# Altium footprint library BGA_Sq_127P.PcbLib: 89 footprints (part 15 of 20) (continued)
## BGA127P35X35-652 [mm] "BGA, 652-Leads, Body 45x45mm, Pitch 1.27mm" (continued)
Top Overlay:
  circle w0.25: c-23.15,21.59 r0.125
  region: -21.67,22.5 -22.5,21.67 -22.5,22.5
  lines w0.2: -22.5,21.67 -21.67,22.5 ; -22.5,-22.5 22.5,-22.5 22.5,22.5 -22.5,22.5 -22.5,-22.5
Mechanical 13:
  lines w0.1: -22.5,-22.5 22.5,-22.5 22.5,22.5 -22.5,22.5 -22.5,-22.5
Mechanical 15:
  lines w0.1: -0.5,0 0.5,0 ; 0,-0.5 0,0.5 ; -23.5,-23.5 23.5,-23.5 23.5,23.5 -23.5,23.5 -23.5,-23.5
3D body: height 3.5, standoff 0, extent -22.5,-22.5 22.5,22.5

## BGA127P35X35-1225 [mm] "BGA, 1225-Leads, Body 45x45mm, Pitch 1.27mm"
height 3.5
pads (1225):
  round 0.6 smd: A1(-21.59,21.59) A2(-20.32,21.59) A3(-19.05,21.59) A4(-17.78,21.59) A5(-16.51,21.59) A6(-15.24,21.59) A7(-13.97,21.59) A8(-12.7,21.59) A9(-11.43,21.59) A10(-10.16,21.59) A11(-8.89,21.59) A12(-7.62,21.59) A13(-6.35,21.59) A14(-5.08,21.59) A15(-3.81,21.59) A16(-2.54,21.59) A17(-1.27,21.59) A18(0,21.59) A19(1.27,21.59) A20(2.54,21.59) A21(3.81,21.59) A22(5.08,21.59) A23(6.35,21.59) A24(7.62,21.59) A25(8.89,21.59) A26(10.16,21.59) A27(11.43,21.59) A28(12.7,21.59) A29(13.97,21.59) A30(15.24,21.59) A31(16.51,21.59) A32(17.78,21.59) A33(19.05,21.59) A34(20.32,21.59) A35(21.59,21.59) AA1(-21.59,-3.81) AA2(-20.32,-3.81) AA3(-19.05,-3.81) AA4(-17.78,-3.81) AA5(-16.51,-3.81) AA6(-15.24,-3.81) AA7(-13.97,-3.81) AA8(-12.7,-3.81) AA9(-11.43,-3.81) AA10(-10.16,-3.81) AA11(-8.89,-3.81) AA12(-7.62,-3.81) AA13(-6.35,-3.81) AA14(-5.08,-3.81) AA15(-3.81,-3.81) AA16(-2.54,-3.81) AA17(-1.27,-3.81) AA18(0,-3.81) AA19(1.27,-3.81) AA20(2.54,-3.81) AA21(3.81,-3.81) AA22(5.08,-3.81) AA23(6.35,-3.81) AA24(7.62,-3.81) AA25(8.89,-3.81) AA26(10.16,-3.81) AA27(11.43,-3.81) AA28(12.7,-3.81) AA29(13.97,-3.81) AA30(15.24,-3.81) AA31(16.51,-3.81) AA32(17.78,-3.81) AA33(19.05,-3.81) AA34(20.32,-3.81) AA35(21.59,-3.81) AB1(-21.59,-5.08) AB2(-20.32,-5.08) AB3(-19.05,-5.08) AB4(-17.78,-5.08) AB5(-16.51,-5.08) AB6(-15.24,-5.08) AB7(-13.97,-5.08) AB8(-12.7,-5.08) AB9(-11.43,-5.08) AB10(-10.16,-5.08) AB11(-8.89,-5.08) AB12(-7.62,-5.08) AB13(-6.35,-5.08) AB14(-5.08,-5.08) AB15(-3.81,-5.08) AB16(-2.54,-5.08) AB17(-1.27,-5.08) AB18(0,-5.08) AB19(1.27,-5.08) AB20(2.54,-5.08) AB21(3.81,-5.08) AB22(5.08,-5.08) AB23(6.35,-5.08) AB24(7.62,-5.08) AB25(8.89,-5.08) AB26(10.16,-5.08) AB27(11.43,-5.08) AB28(12.7,-5.08) AB29(13.97,-5.08) AB30(15.24,-5.08) AB31(16.51,-5.08) AB32(17.78,-5.08) AB33(19.05,-5.08) AB34(20.32,-5.08) AB35(21.59,-5.08) AC1(-21.59,-6.35) AC2(-20.32,-6.35) AC3(-19.05,-6.35) AC4(-17.78,-6.35) AC5(-16.51,-6.35) AC6(-15.24,-6.35) AC7(-13.97,-6.35) AC8(-12.7,-6.35) AC9(-11.43,-6.35) AC10(-10.16,-6.35) AC11(-8.89,-6.35) AC12(-7.62,-6.35) AC13(-6.35,-6.35) AC14(-5.08,-6.35) AC15(-3.81,-6.35) AC16(-2.54,-6.35) AC17(-1.27,-6.35) AC18(0,-6.35) AC19(1.27,-6.35) AC20(2.54,-6.35) AC21(3.81,-6.35) AC22(5.08,-6.35) AC23(6.35,-6.35) AC24(7.62,-6.35) AC25(8.89,-6.35) AC26(10.16,-6.35) AC27(11.43,-6.35) AC28(12.7,-6.35) AC29(13.97,-6.35) AC30(15.24,-6.35) AC31(16.51,-6.35) AC32(17.78,-6.35) AC33(19.05,-6.35) AC34(20.32,-6.35) AC35(21.59,-6.35) AD1(-21.59,-7.62) AD2(-20.32,-7.62) AD3(-19.05,-7.62) AD4(-17.78,-7.62) AD5(-16.51,-7.62) AD6(-15.24,-7.62) AD7(-13.97,-7.62) AD8(-12.7,-7.62) AD9(-11.43,-7.62) AD10(-10.16,-7.62) AD11(-8.89,-7.62) AD12(-7.62,-7.62) AD13(-6.35,-7.62) AD14(-5.08,-7.62) AD15(-3.81,-7.62) AD16(-2.54,-7.62) AD17(-1.27,-7.62) AD18(0,-7.62) AD19(1.27,-7.62) AD20(2.54,-7.62) AD21(3.81,-7.62) AD22(5.08,-7.62) AD23(6.35,-7.62) AD24(7.62,-7.62) AD25(8.89,-7.62) AD26(10.16,-7.62) AD27(11.43,-7.62) AD28(12.7,-7.62) AD29(13.97,-7.62) AD30(15.24,-7.62) AD31(16.51,-7.62) AD32(17.78,-7.62) AD33(19.05,-7.62) AD34(20.32,-7.62) AD35(21.59,-7.62) AE1(-21.59,-8.89) AE2(-20.32,-8.89) AE3(-19.05,-8.89) AE4(-17.78,-8.89) AE5(-16.51,-8.89) AE6(-15.24,-8.89) AE7(-13.97,-8.89) AE8(-12.7,-8.89) AE9(-11.43,-8.89) AE10(-10.16,-8.89) AE11(-8.89,-8.89) AE12(-7.62,-8.89) AE13(-6.35,-8.89) AE14(-5.08,-8.89) AE15(-3.81,-8.89) AE16(-2.54,-8.89) AE17(-1.27,-8.89) AE18(0,-8.89) AE19(1.27,-8.89) AE20(2.54,-8.89) AE21(3.81,-8.89) AE22(5.08,-8.89) AE23(6.35,-8.89) AE24(7.62,-8.89) AE25(8.89,-8.89) AE26(10.16,-8.89) AE27(11.43,-8.89) AE28(12.7,-8.89) AE29(13.97,-8.89) AE30(15.24,-8.89) AE31(16.51,-8.89) AE32(17.78,-8.89) AE33(19.05,-8.89) AE34(20.32,-8.89) AE35(21.59,-8.89) AF1(-21.59,-10.16) AF2(-20.32,-10.16) AF3(-19.05,-10.16) AF4(-17.78,-10.16) AF5(-16.51,-10.16) AF6(-15.24,-10.16) AF7(-13.97,-10.16) AF8(-12.7,-10.16) AF9(-11.43,-10.16) AF10(-10.16,-10.16) AF11(-8.89,-10.16) AF12(-7.62,-10.16) AF13(-6.35,-10.16) AF14(-5.08,-10.16) AF15(-3.81,-10.16) AF16(-2.54,-10.16) AF17(-1.27,-10.16) AF18(0,-10.16) AF19(1.27,-10.16) AF20(2.54,-10.16) AF21(3.81,-10.16) AF22(5.08,-10.16) AF23(6.35,-10.16) AF24(7.62,-10.16) AF25(8.89,-10.16) AF26(10.16,-10.16) AF27(11.43,-10.16) AF28(12.7,-10.16) AF29(13.97,-10.16) AF30(15.24,-10.16) AF31(16.51,-10.16) AF32(17.78,-10.16) AF33(19.05,-10.16) AF34(20.32,-10.16) AF35(21.59,-10.16) AG1(-21.59,-11.43) AG2(-20.32,-11.43) AG3(-19.05,-11.43) AG4(-17.78,-11.43) AG5(-16.51,-11.43) AG6(-15.24,-11.43) AG7(-13.97,-11.43) AG8(-12.7,-11.43) AG9(-11.43,-11.43) AG10(-10.16,-11.43) AG11(-8.89,-11.43) AG12(-7.62,-11.43) AG13(-6.35,-11.43) AG14(-5.08,-11.43) AG15(-3.81,-11.43) AG16(-2.54,-11.43) AG17(-1.27,-11.43) AG18(0,-11.43) AG19(1.27,-11.43) AG20(2.54,-11.43) AG21(3.81,-11.43) AG22(5.08,-11.43) AG23(6.35,-11.43) AG24(7.62,-11.43) AG25(8.89,-11.43) AG26(10.16,-11.43) AG27(11.43,-11.43) AG28(12.7,-11.43) AG29(13.97,-11.43) AG30(15.24,-11.43) AG31(16.51,-11.43) AG32(17.78,-11.43) AG33(19.05,-11.43) AG34(20.32,-11.43) AG35(21.59,-11.43) AH1(-21.59,-12.7) AH2(-20.32,-12.7) AH3(-19.05,-12.7) AH4(-17.78,-12.7) AH5(-16.51,-12.7) AH6(-15.24,-12.7) AH7(-13.97,-12.7) AH8(-12.7,-12.7) AH9(-11.43,-12.7) AH10(-10.16,-12.7) AH11(-8.89,-12.7) AH12(-7.62,-12.7) AH13(-6.35,-12.7) AH14(-5.08,-12.7) AH15(-3.81,-12.7) AH16(-2.54,-12.7) AH17(-1.27,-12.7) AH18(0,-12.7) AH19(1.27,-12.7) AH20(2.54,-12.7) AH21(3.81,-12.7) AH22(5.08,-12.7) AH23(6.35,-12.7) AH24(7.62,-12.7) AH25(8.89,-12.7) AH26(10.16,-12.7) AH27(11.43,-12.7) AH28(12.7,-12.7) AH29(13.97,-12.7) AH30(15.24,-12.7) AH31(16.51,-12.7) AH32(17.78,-12.7) AH33(19.05,-12.7) AH34(20.32,-12.7) AH35(21.59,-12.7) AJ1(-21.59,-13.97) AJ2(-20.32,-13.97) AJ3(-19.05,-13.97) AJ4(-17.78,-13.97) AJ5(-16.51,-13.97) AJ6(-15.24,-13.97) AJ7(-13.97,-13.97) AJ8(-12.7,-13.97) AJ9(-11.43,-13.97) AJ10(-10.16,-13.97) AJ11(-8.89,-13.97) AJ12(-7.62,-13.97) AJ13(-6.35,-13.97) AJ14(-5.08,-13.97) AJ15(-3.81,-13.97) AJ16(-2.54,-13.97) AJ17(-1.27,-13.97) AJ18(0,-13.97) AJ19(1.27,-13.97) AJ20(2.54,-13.97) AJ21(3.81,-13.97) AJ22(5.08,-13.97) AJ23(6.35,-13.97) AJ24(7.62,-13.97) AJ25(8.89,-13.97) AJ26(10.16,-13.97) AJ27(11.43,-13.97) AJ28(12.7,-13.97) AJ29(13.97,-13.97) AJ30(15.24,-13.97) AJ31(16.51,-13.97) AJ32(17.78,-13.97) AJ33(19.05,-13.97) AJ34(20.32,-13.97) AJ35(21.59,-13.97) AK1(-21.59,-15.24) AK2(-20.32,-15.24) AK3(-19.05,-15.24) AK4(-17.78,-15.24) AK5(-16.51,-15.24) AK6(-15.24,-15.24) AK7(-13.97,-15.24) AK8(-12.7,-15.24) AK9(-11.43,-15.24) AK10(-10.16,-15.24) AK11(-8.89,-15.24) AK12(-7.62,-15.24) AK13(-6.35,-15.24) AK14(-5.08,-15.24) AK15(-3.81,-15.24) AK16(-2.54,-15.24) AK17(-1.27,-15.24) AK18(0,-15.24) AK19(1.27,-15.24) AK20(2.54,-15.24) AK21(3.81,-15.24) AK22(5.08,-15.24) AK23(6.35,-15.24) AK24(7.62,-15.24) AK25(8.89,-15.24) AK26(10.16,-15.24) AK27(11.43,-15.24) AK28(12.7,-15.24) AK29(13.97,-15.24) AK30(15.24,-15.24) AK31(16.51,-15.24) AK32(17.78,-15.24) AK33(19.05,-15.24) AK34(20.32,-15.24) AK35(21.59,-15.24) AL1(-21.59,-16.51) AL2(-20.32,-16.51) AL3(-19.05,-16.51) AL4(-17.78,-16.51) AL5(-16.51,-16.51) AL6(-15.24,-16.51) AL7(-13.97,-16.51) AL8(-12.7,-16.51) AL9(-11.43,-16.51) AL10(-10.16,-16.51) AL11(-8.89,-16.51) AL12(-7.62,-16.51) AL13(-6.35,-16.51) AL14(-5.08,-16.51) AL15(-3.81,-16.51) AL16(-2.54,-16.51) AL17(-1.27,-16.51) AL18(0,-16.51) AL19(1.27,-16.51) AL20(2.54,-16.51) AL21(3.81,-16.51) AL22(5.08,-16.51) AL23(6.35,-16.51) AL24(7.62,-16.51) AL25(8.89,-16.51) AL26(10.16,-16.51) AL27(11.43,-16.51) AL28(12.7,-16.51) AL29(13.97,-16.51) AL30(15.24,-16.51) AL31(16.51,-16.51) AL32(17.78,-16.51) AL33(19.05,-16.51) AL34(20.32,-16.51) AL35(21.59,-16.51) AM1(-21.59,-17.78) AM2(-20.32,-17.78) AM3(-19.05,-17.78) AM4(-17.78,-17.78) AM5(-16.51,-17.78) AM6(-15.24,-17.78) AM7(-13.97,-17.78) AM8(-12.7,-17.78) AM9(-11.43,-17.78) AM10(-10.16,-17.78) AM11(-8.89,-17.78) AM12(-7.62,-17.78) AM13(-6.35,-17.78) AM14(-5.08,-17.78) AM15(-3.81,-17.78) AM16(-2.54,-17.78) AM17(-1.27,-17.78) AM18(0,-17.78) AM19(1.27,-17.78) AM20(2.54,-17.78) AM21(3.81,-17.78) AM22(5.08,-17.78) AM23(6.35,-17.78) AM24(7.62,-17.78) AM25(8.89,-17.78) AM26(10.16,-17.78) AM27(11.43,-17.78) AM28(12.7,-17.78) AM29(13.97,-17.78) AM30(15.24,-17.78) AM31(16.51,-17.78) AM32(17.78,-17.78) AM33(19.05,-17.78) AM34(20.32,-17.78) AM35(21.59,-17.78) AN1(-21.59,-19.05) AN2(-20.32,-19.05) AN3(-19.05,-19.05) AN4(-17.78,-19.05) AN5(-16.51,-19.05) AN6(-15.24,-19.05) AN7(-13.97,-19.05) AN8(-12.7,-19.05) AN9(-11.43,-19.05) AN10(-10.16,-19.05) AN11(-8.89,-19.05) AN12(-7.62,-19.05) AN13(-6.35,-19.05) AN14(-5.08,-19.05) AN15(-3.81,-19.05) AN16(-2.54,-19.05) AN17(-1.27,-19.05) AN18(0,-19.05) AN19(1.27,-19.05) AN20(2.54,-19.05) AN21(3.81,-19.05) AN22(5.08,-19.05) AN23(6.35,-19.05) AN24(7.62,-19.05) AN25(8.89,-19.05) AN26(10.16,-19.05) AN27(11.43,-19.05) AN28(12.7,-19.05) AN29(13.97,-19.05) AN30(15.24,-19.05) AN31(16.51,-19.05) AN32(17.78,-19.05) AN33(19.05,-19.05) AN34(20.32,-19.05) AN35(21.59,-19.05) AP1(-21.59,-20.32) AP2(-20.32,-20.32) AP3(-19.05,-20.32) AP4(-17.78,-20.32) AP5(-16.51,-20.32) AP6(-15.24,-20.32) AP7(-13.97,-20.32) AP8(-12.7,-20.32) AP9(-11.43,-20.32) AP10(-10.16,-20.32) AP11(-8.89,-20.32) AP12(-7.62,-20.32) AP13(-6.35,-20.32) AP14(-5.08,-20.32) AP15(-3.81,-20.32) AP16(-2.54,-20.32) AP17(-1.27,-20.32) AP18(0,-20.32) AP19(1.27,-20.32) AP20(2.54,-20.32) AP21(3.81,-20.32) AP22(5.08,-20.32) AP23(6.35,-20.32) AP24(7.62,-20.32) AP25(8.89,-20.32) AP26(10.16,-20.32) AP27(11.43,-20.32) AP28(12.7,-20.32) AP29(13.97,-20.32) AP30(15.24,-20.32) AP31(16.51,-20.32) AP32(17.78,-20.32) AP33(19.05,-20.32) AP34(20.32,-20.32) AP35(21.59,-20.32) AR1(-21.59,-21.59) AR2(-20.32,-21.59) AR3(-19.05,-21.59) AR4(-17.78,-21.59) AR5(-16.51,-21.59) AR6(-15.24,-21.59) AR7(-13.97,-21.59) AR8(-12.7,-21.59) AR9(-11.43,-21.59) AR10(-10.16,-21.59) AR11(-8.89,-21.59) AR12(-7.62,-21.59) AR13(-6.35,-21.59) AR14(-5.08,-21.59) AR15(-3.81,-21.59) AR16(-2.54,-21.59) AR17(-1.27,-21.59) AR18(0,-21.59) AR19(1.27,-21.59) AR20(2.54,-21.59) AR21(3.81,-21.59) AR22(5.08,-21.59) AR23(6.35,-21.59) AR24(7.62,-21.59) AR25(8.89,-21.59) AR26(10.16,-21.59) AR27(11.43,-21.59) AR28(12.7,-21.59) AR29(13.97,-21.59) AR30(15.24,-21.59) AR31(16.51,-21.59) AR32(17.78,-21.59) AR33(19.05,-21.59) AR34(20.32,-21.59) AR35(21.59,-21.59) B1(-21.59,20.32) B2(-20.32,20.32) B3(-19.05,20.32) B4(-17.78,20.32) B5(-16.51,20.32) B6(-15.24,20.32) B7(-13.97,20.32) B8(-12.7,20.32) B9(-11.43,20.32) B10(-10.16,20.32) B11(-8.89,20.32) B12(-7.62,20.32) B13(-6.35,20.32) B14(-5.08,20.32) B15(-3.81,20.32) B16(-2.54,20.32) B17(-1.27,20.32) B18(0,20.32) B19(1.27,20.32) B20(2.54,20.32) B21(3.81,20.32) B22(5.08,20.32) B23(6.35,20.32) B24(7.62,20.32) B25(8.89,20.32) B26(10.16,20.32) B27(11.43,20.32) B28(12.7,20.32) B29(13.97,20.32) B30(15.24,20.32) B31(16.51,20.32) B32(17.78,20.32) B33(19.05,20.32) B34(20.32,20.32) B35(21.59,20.32) C1(-21.59,19.05) C2(-20.32,19.05) C3(-19.05,19.05) C4(-17.78,19.05) C5(-16.51,19.05) C6(-15.24,19.05) C7(-13.97,19.05) C8(-12.7,19.05) C9(-11.43,19.05) C10(-10.16,19.05) C11(-8.89,19.05) C12(-7.62,19.05) C13(-6.35,19.05) C14(-5.08,19.05) C15(-3.81,19.05) C16(-2.54,19.05) C17(-1.27,19.05) C18(0,19.05) C19(1.27,19.05) C20(2.54,19.05) C21(3.81,19.05) C22(5.08,19.05) C23(6.35,19.05) C24(7.62,19.05) C25(8.89,19.05) C26(10.16,19.05) C27(11.43,19.05) C28(12.7,19.05) C29(13.97,19.05) C30(15.24,19.05) C31(16.51,19.05) C32(17.78,19.05) C33(19.05,19.05) C34(20.32,19.05) C35(21.59,19.05) D1(-21.59,17.78) D2(-20.32,17.78) D3(-19.05,17.78) D4(-17.78,17.78) D5(-16.51,17.78) D6(-15.24,17.78) D7(-13.97,17.78) D8(-12.7,17.78) D9(-11.43,17.78) D10(-10.16,17.78) D11(-8.89,17.78) D12(-7.62,17.78) D13(-6.35,17.78) D14(-5.08,17.78) D15(-3.81,17.78) D16(-2.54,17.78) D17(-1.27,17.78) D18(0,17.78) D19(1.27,17.78) D20(2.54,17.78) D21(3.81,17.78) D22(5.08,17.78) D23(6.35,17.78) D24(7.62,17.78) D25(8.89,17.78) D26(10.16,17.78) D27(11.43,17.78) D28(12.7,17.78) D29(13.97,17.78) D30(15.24,17.78) D31(16.51,17.78) D32(17.78,17.78) D33(19.05,17.78) D34(20.32,17.78) D35(21.59,17.78) E1(-21.59,16.51) E2(-20.32,16.51) E3(-19.05,16.51) E4(-17.78,16.51) E5(-16.51,16.51) E6(-15.24,16.51) E7(-13.97,16.51) E8(-12.7,16.51) E9(-11.43,16.51) E10(-10.16,16.51) E11(-8.89,16.51) E12(-7.62,16.51) E13(-6.35,16.51) E14(-5.08,16.51) E15(-3.81,16.51) E16(-2.54,16.51) E17(-1.27,16.51) E18(0,16.51) E19(1.27,16.51) E20(2.54,16.51) E21(3.81,16.51) E22(5.08,16.51) E23(6.35,16.51) E24(7.62,16.51) E25(8.89,16.51) E26(10.16,16.51) E27(11.43,16.51) E28(12.7,16.51) E29(13.97,16.51) E30(15.24,16.51) E31(16.51,16.51) E32(17.78,16.51) E33(19.05,16.51) E34(20.32,16.51) E35(21.59,16.51) F1(-21.59,15.24) F2(-20.32,15.24) F3(-19.05,15.24) F4(-17.78,15.24) F5(-16.51,15.24) F6(-15.24,15.24) F7(-13.97,15.24) F8(-12.7,15.24) F9(-11.43,15.24) F10(-10.16,15.24) F11(-8.89,15.24) F12(-7.62,15.24) F13(-6.35,15.24) F14(-5.08,15.24) F15(-3.81,15.24) F16(-2.54,15.24) F17(-1.27,15.24) F18(0,15.24) F19(1.27,15.24) F20(2.54,15.24) F21(3.81,15.24) F22(5.08,15.24) F23(6.35,15.24) F24(7.62,15.24) F25(8.89,15.24) F26(10.16,15.24) F27(11.43,15.24) F28(12.7,15.24) F29(13.97,15.24) F30(15.24,15.24) F31(16.51,15.24) F32(17.78,15.24) F33(19.05,15.24) F34(20.32,15.24) F35(21.59,15.24) G1(-21.59,13.97) G2(-20.32,13.97) G3(-19.05,13.97) G4(-17.78,13.97) G5(-16.51,13.97) G6(-15.24,13.97) G7(-13.97,13.97) G8(-12.7,13.97) G9(-11.43,13.97) G10(-10.16,13.97) G11(-8.89,13.97) G12(-7.62,13.97) G13(-6.35,13.97) G14(-5.08,13.97) G15(-3.81,13.97) G16(-2.54,13.97) G17(-1.27,13.97) G18(0,13.97) G19(1.27,13.97) G20(2.54,13.97) G21(3.81,13.97) G22(5.08,13.97) G23(6.35,13.97) G24(7.62,13.97) G25(8.89,13.97) G26(10.16,13.97) G27(11.43,13.97) G28(12.7,13.97) G29(13.97,13.97) G30(15.24,13.97) G31(16.51,13.97) G32(17.78,13.97) G33(19.05,13.97) G34(20.32,13.97) G35(21.59,13.97) H1(-21.59,12.7) H2(-20.32,12.7) H3(-19.05,12.7) H4(-17.78,12.7) H5(-16.51,12.7) H6(-15.24,12.7) H7(-13.97,12.7) H8(-12.7,12.7) H9(-11.43,12.7) H10(-10.16,12.7) H11(-8.89,12.7) H12(-7.62,12.7) H13(-6.35,12.7) H14(-5.08,12.7) H15(-3.81,12.7) H16(-2.54,12.7) H17(-1.27,12.7) H18(0,12.7) H19(1.27,12.7) H20(2.54,12.7) H21(3.81,12.7) H22(5.08,12.7) H23(6.35,12.7) H24(7.62,12.7) H25(8.89,12.7) H26(10.16,12.7) H27(11.43,12.7) H28(12.7,12.7) H29(13.97,12.7) H30(15.24,12.7) H31(16.51,12.7) H32(17.78,12.7) H33(19.05,12.7) H34(20.32,12.7) H35(21.59,12.7) J1(-21.59,11.43) J2(-20.32,11.43) J3(-19.05,11.43) J4(-17.78,11.43) J5(-16.51,11.43) J6(-15.24,11.43) J7(-13.97,11.43) J8(-12.7,11.43) J9(-11.43,11.43) J10(-10.16,11.43) J11(-8.89,11.43) J12(-7.62,11.43) J13(-6.35,11.43) J14(-5.08,11.43) J15(-3.81,11.43) J16(-2.54,11.43) J17(-1.27,11.43) J18(0,11.43) J19(1.27,11.43) J20(2.54,11.43) J21(3.81,11.43) J22(5.08,11.43) J23(6.35,11.43) J24(7.62,11.43) J25(8.89,11.43) J26(10.16,11.43) J27(11.43,11.43) J28(12.7,11.43) J29(13.97,11.43) J30(15.24,11.43) J31(16.51,11.43) J32(17.78,11.43) J33(19.05,11.43) J34(20.32,11.43) J35(21.59,11.43) K1(-21.59,10.16) K2(-20.32,10.16) K3(-19.05,10.16) K4(-17.78,10.16) K5(-16.51,10.16) K6(-15.24,10.16) K7(-13.97,10.16) K8(-12.7,10.16) K9(-11.43,10.16) K10(-10.16,10.16) K11(-8.89,10.16) K12(-7.62,10.16) K13(-6.35,10.16) K14(-5.08,10.16) K15(-3.81,10.16) K16(-2.54,10.16) K17(-1.27,10.16) K18(0,10.16) K19(1.27,10.16) K20(2.54,10.16) K21(3.81,10.16) K22(5.08,10.16) K23(6.35,10.16) K24(7.62,10.16) K25(8.89,10.16) K26(10.16,10.16) K27(11.43,10.16) K28(12.7,10.16) K29(13.97,10.16) K30(15.24,10.16) K31(16.51,10.16) K32(17.78,10.16) K33(19.05,10.16) K34(20.32,10.16) K35(21.59,10.16) L1(-21.59,8.89) L2(-20.32,8.89) L3(-19.05,8.89) L4(-17.78,8.89) L5(-16.51,8.89) L6(-15.24,8.89) L7(-13.97,8.89) L8(-12.7,8.89) L9(-11.43,8.89) L10(-10.16,8.89) L11(-8.89,8.89) L12(-7.62,8.89) L13(-6.35,8.89) L14(-5.08,8.89) L15(-3.81,8.89) L16(-2.54,8.89) L17(-1.27,8.89) L18(0,8.89) L19(1.27,8.89) L20(2.54,8.89) L21(3.81,8.89) L22(5.08,8.89) L23(6.35,8.89) L24(7.62,8.89) L25(8.89,8.89) L26(10.16,8.89) L27(11.43,8.89) L28(12.7,8.89) L29(13.97,8.89) L30(15.24,8.89) L31(16.51,8.89) L32(17.78,8.89) L33(19.05,8.89) L34(20.32,8.89) L35(21.59,8.89) M1(-21.59,7.62) M2(-20.32,7.62) M3(-19.05,7.62) M4(-17.78,7.62) M5(-16.51,7.62) M6(-15.24,7.62) M7(-13.97,7.62) M8(-12.7,7.62) M9(-11.43,7.62) M10(-10.16,7.62) M11(-8.89,7.62) M12(-7.62,7.62) M13(-6.35,7.62) M14(-5.08,7.62) M15(-3.81,7.62) M16(-2.54,7.62) M17(-1.27,7.62) M18(0,7.62) M19(1.27,7.62) M20(2.54,7.62) M21(3.81,7.62) M22(5.08,7.62) M23(6.35,7.62) M24(7.62,7.62) M25(8.89,7.62) M26(10.16,7.62) M27(11.43,7.62) M28(12.7,7.62) M29(13.97,7.62) M30(15.24,7.62) M31(16.51,7.62) M32(17.78,7.62) M33(19.05,7.62) M34(20.32,7.62) M35(21.59,7.62) N1(-21.59,6.35) N2(-20.32,6.35) N3(-19.05,6.35) N4(-17.78,6.35) N5(-16.51,6.35) N6(-15.24,6.35) N7(-13.97,6.35) N8(-12.7,6.35) N9(-11.43,6.35) N10(-10.16,6.35) N11(-8.89,6.35) N12(-7.62,6.35) N13(-6.35,6.35) N14(-5.08,6.35) N15(-3.81,6.35) N16(-2.54,6.35) N17(-1.27,6.35) N18(0,6.35) N19(1.27,6.35) N20(2.54,6.35) N21(3.81,6.35) N22(5.08,6.35) N23(6.35,6.35) N24(7.62,6.35) N25(8.89,6.35) N26(10.16,6.35) N27(11.43,6.35) N28(12.7,6.35) N29(13.97,6.35) N30(15.24,6.35) N31(16.51,6.35) N32(17.78,6.35) N33(19.05,6.35) N34(20.32,6.35) N35(21.59,6.35) P1(-21.59,5.08) P2(-20.32,5.08) P3(-19.05,5.08) P4(-17.78,5.08) P5(-16.51,5.08) P6(-15.24,5.08) P7(-13.97,5.08) P8(-12.7,5.08) P9(-11.43,5.08) P10(-10.16,5.08) P11(-8.89,5.08) P12(-7.62,5.08) P13(-6.35,5.08) P14(-5.08,5.08) P15(-3.81,5.08) P16(-2.54,5.08) P17(-1.27,5.08) P18(0,5.08) P19(1.27,5.08) P20(2.54,5.08) P21(3.81,5.08) P22(5.08,5.08) P23(6.35,5.08) P24(7.62,5.08) P25(8.89,5.08) P26(10.16,5.08) P27(11.43,5.08) P28(12.7,5.08) P29(13.97,5.08) P30(15.24,5.08) P31(16.51,5.08) P32(17.78,5.08) P33(19.05,5.08) P34(20.32,5.08) P35(21.59,5.08) R1(-21.59,3.81) R2(-20.32,3.81) R3(-19.05,3.81) R4(-17.78,3.81) R5(-16.51,3.81) R6(-15.24,3.81) R7(-13.97,3.81) R8(-12.7,3.81) R9(-11.43,3.81) R10(-10.16,3.81) R11(-8.89,3.81) R12(-7.62,3.81) R13(-6.35,3.81) R14(-5.08,3.81) R15(-3.81,3.81) R16(-2.54,3.81) R17(-1.27,3.81) R18(0,3.81) R19(1.27,3.81) R20(2.54,3.81) R21(3.81,3.81) R22(5.08,3.81) R23(6.35,3.81) R24(7.62,3.81) R25(8.89,3.81) R26(10.16,3.81) R27(11.43,3.81) R28(12.7,3.81) R29(13.97,3.81) R30(15.24,3.81) R31(16.51,3.81) R32(17.78,3.81) R33(19.05,3.81) R34(20.32,3.81) R35(21.59,3.81) T1(-21.59,2.54) T2(-20.32,2.54) T3(-19.05,2.54) T4(-17.78,2.54) T5(-16.51,2.54) T6(-15.24,2.54) T7(-13.97,2.54) T8(-12.7,2.54) T9(-11.43,2.54) T10(-10.16,2.54) T11(-8.89,2.54) T12(-7.62,2.54) T13(-6.35,2.54) T14(-5.08,2.54) T15(-3.81,2.54) T16(-2.54,2.54) T17(-1.27,2.54) T18(0,2.54) T19(1.27,2.54) T20(2.54,2.54) T21(3.81,2.54) T22(5.08,2.54) T23(6.35,2.54) T24(7.62,2.54) T25(8.89,2.54) T26(10.16,2.54) T27(11.43,2.54) T28(12.7,2.54) T29(13.97,2.54) T30(15.24,2.54) T31(16.51,2.54) T32(17.78,2.54) T33(19.05,2.54) T34(20.32,2.54) T35(21.59,2.54) U1(-21.59,1.27) U2(-20.32,1.27) U3(-19.05,1.27) U4(-17.78,1.27) U5(-16.51,1.27) U6(-15.24,1.27) U7(-13.97,1.27) U8(-12.7,1.27) U9(-11.43,1.27) U10(-10.16,1.27) U11(-8.89,1.27) U12(-7.62,1.27) U13(-6.35,1.27) U14(-5.08,1.27) U15(-3.81,1.27) U16(-2.54,1.27) U17(-1.27,1.27) U18(0,1.27) U19(1.27,1.27) U20(2.54,1.27) U21(3.81,1.27) U22(5.08,1.27) U23(6.35,1.27) U24(7.62,1.27) U25(8.89,1.27) U26(10.16,1.27) U27(11.43,1.27) U28(12.7,1.27) U29(13.97,1.27) U30(15.24,1.27) U31(16.51,1.27) U32(17.78,1.27) U33(19.05,1.27) U34(20.32,1.27) U35(21.59,1.27) V1(-21.59,0) V2(-20.32,0) V3(-19.05,0) V4(-17.78,0) V5(-16.51,0) V6(-15.24,0) V7(-13.97,0) V8(-12.7,0) V9(-11.43,0) V10(-10.16,0) V11(-8.89,0) V12(-7.62,0) V13(-6.35,0) V14(-5.08,0) V15(-3.81,0) V16(-2.54,0) V17(-1.27,0) V18(0,0) V19(1.27,0) V20(2.54,0) V21(3.81,0) V22(5.08,0) V23(6.35,0) V24(7.62,0) V25(8.89,0) V26(10.16,0) V27(11.43,0) V28(12.7,0) V29(13.97,0) V30(15.24,0) V31(16.51,0) V32(17.78,0) V33(19.05,0) V34(20.32,0) V35(21.59,0) W1(-21.59,-1.27) W2(-20.32,-1.27) W3(-19.05,-1.27) W4(-17.78,-1.27) W5(-16.51,-1.27) W6(-15.24,-1.27) W7(-13.97,-1.27) W8(-12.7,-1.27) W9(-11.43,-1.27) W10(-10.16,-1.27) W11(-8.89,-1.27) W12(-7.62,-1.27) W13(-6.35,-1.27) W14(-5.08,-1.27) W15(-3.81,-1.27) W16(-2.54,-1.27) W17(-1.27,-1.27) W18(0,-1.27) W19(1.27,-1.27) W20(2.54,-1.27) W21(3.81,-1.27) W22(5.08,-1.27) W23(6.35,-1.27) W24(7.62,-1.27) W25(8.89,-1.27) W26(10.16,-1.27) W27(11.43,-1.27) W28(12.7,-1.27) W29(13.97,-1.27) W30(15.24,-1.27) W31(16.51,-1.27) W32(17.78,-1.27) W33(19.05,-1.27) W34(20.32,-1.27) W35(21.59,-1.27) Y1(-21.59,-2.54) Y2(-20.32,-2.54) Y3(-19.05,-2.54) Y4(-17.78,-2.54) Y5(-16.51,-2.54) Y6(-15.24,-2.54) Y7(-13.97,-2.54) Y8(-12.7,-2.54) Y9(-11.43,-2.54) Y10(-10.16,-2.54) Y11(-8.89,-2.54) Y12(-7.62,-2.54) Y13(-6.35,-2.54) Y14(-5.08,-2.54) Y15(-3.81,-2.54) Y16(-2.54,-2.54) Y17(-1.27,-2.54) Y18(0,-2.54) Y19(1.27,-2.54) Y20(2.54,-2.54) Y21(3.81,-2.54) Y22(5.08,-2.54) Y23(6.35,-2.54) Y24(7.62,-2.54) Y25(8.89,-2.54) Y26(10.16,-2.54) Y27(11.43,-2.54) Y28(12.7,-2.54) Y29(13.97,-2.54) Y30(15.24,-2.54) Y31(16.51,-2.54) Y32(17.78,-2.54) Y33(19.05,-2.54) Y34(20.32,-2.54) Y35(21.59,-2.54)
Top Overlay:
  circle w0.25: c-23.15,21.59 r0.125
  region: -21.67,22.5 -22.5,21.67 -22.5,22.5
  lines w0.2: -22.5,21.67 -21.67,22.5 ; -22.5,-22.5 -22.5,22.5 22.5,22.5 22.5,-22.5 -22.5,-22.5
Mechanical 13:
  lines w0.1: -22.5,-22.5 -22.5,22.5 22.5,22.5 22.5,-22.5 -22.5,-22.5
Mechanical 15:
  lines w0.1: -0.5,0 0.5,0 ; 0,-0.5 0,0.5 ; -23.5,-23.5 -23.5,23.5 23.5,23.5 23.5,-23.5 -23.5,-23.5
3D body: height 3.5, standoff 0, extent -22.5,-22.5 22.5,22.5